# Altium footprint library 13-IC Packages-1bga1.PcbLib: 72 footprints (part 3 of 6)
Each footprint in its own frame and in the unit in brackets; x right, y up, seen from the top. Pads: shape width x height; smd on the part's side, far side on the other; paste and mask are expansions set on the pad; w line width, h text height; cw(c..) or ccw(c..) is an arc to the next point about the centre after c.
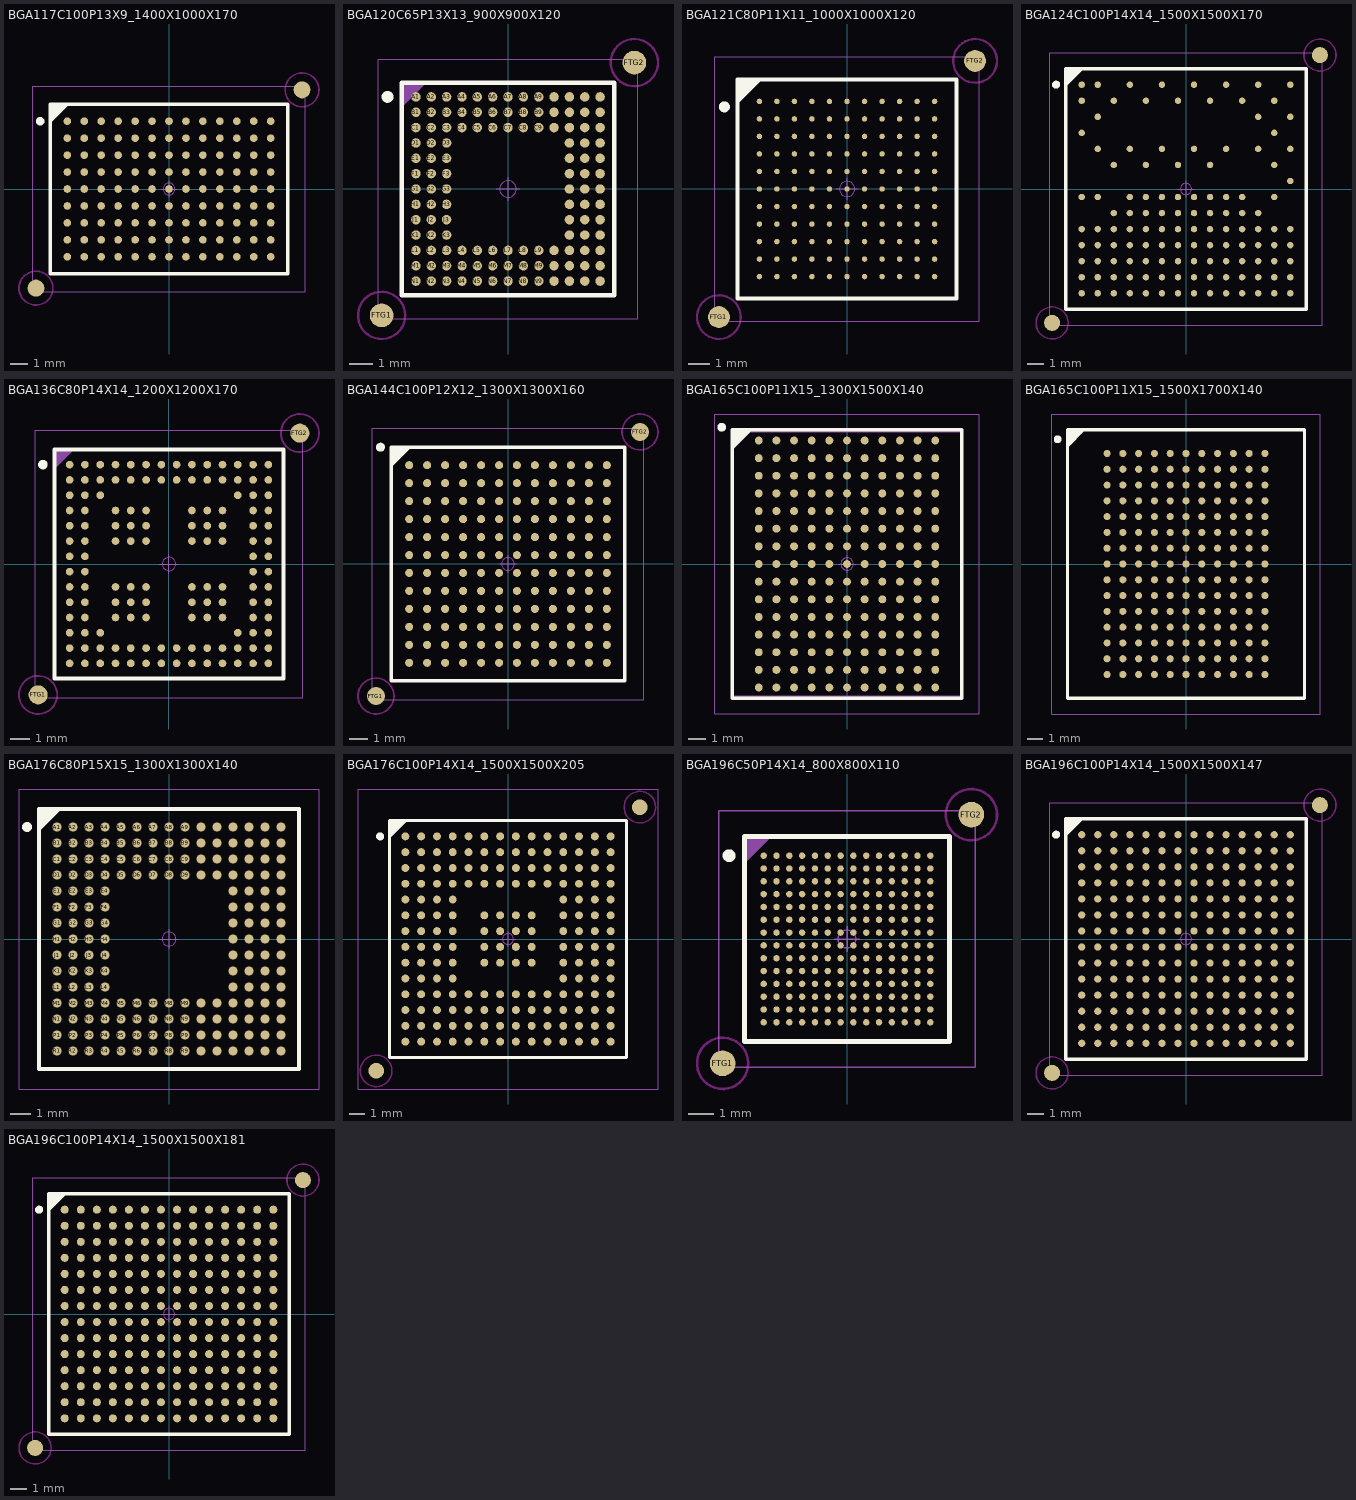
[diagram p2: the footprints below, top view; thin cyan lines are the x and y axes]

## BGA117C100P13X9_1400X1000X170 [mm] "BGA, 1.00mm Pitch, Rect.; 117 pin, 13 Columns X 9 Rows, 14.00mm X 10.00mm X 1.70mm H"
height 1.7
pads (119):
  round 0.45 smd: A1(-6,4) A2(-5,4) A3(-4,4) A4(-3,4) A5(-2,4) A6(-1,4) A7(0,4) A8(1,4) A9(2,4) A10(3,4) A11(4,4) A12(5,4) A13(6,4) B1(-6,3) B2(-5,3) B3(-4,3) B4(-3,3) B5(-2,3) B6(-1,3) B7(0,3) B8(1,3) B9(2,3) B10(3,3) B11(4,3) B12(5,3) B13(6,3) C1(-6,2) C2(-5,2) C3(-4,2) C4(-3,2) C5(-2,2) C6(-1,2) C7(0,2) C8(1,2) C9(2,2) C10(3,2) C11(4,2) C12(5,2) C13(6,2) D1(-6,1) D2(-5,1) D3(-4,1) D4(-3,1) D5(-2,1) D6(-1,1) D7(0,1) D8(1,1) D9(2,1) D10(3,1) D11(4,1) D12(5,1) D13(6,1) E1(-6,0) E2(-5,0) E3(-4,0) E4(-3,0) E5(-2,0) E6(-1,0) E7(0,0) E8(1,0) E9(2,0) E10(3,0) E11(4,0) E12(5,0) E13(6,0) F1(-6,-1) F2(-5,-1) F3(-4,-1) F4(-3,-1) F5(-2,-1) F6(-1,-1) F7(0,-1) F8(1,-1) F9(2,-1) F10(3,-1) F11(4,-1) F12(5,-1) F13(6,-1) G1(-6,-2) G2(-5,-2) G3(-4,-2) G4(-3,-2) G5(-2,-2) G6(-1,-2) G7(0,-2) G8(1,-2) G9(2,-2) G10(3,-2) G11(4,-2) G12(5,-2) G13(6,-2) H1(-6,-3) H2(-5,-3) H3(-4,-3) H4(-3,-3) H5(-2,-3) H6(-1,-3) H7(0,-3) H8(1,-3) H9(2,-3) H10(3,-3) H11(4,-3) H12(5,-3) H13(6,-3) J1(-6,-4) J2(-5,-4) J3(-4,-4) J4(-3,-4) J5(-2,-4) J6(-1,-4) J7(0,-4) J8(1,-4) J9(2,-4) J10(3,-4) J11(4,-4) J12(5,-4) J13(6,-4)
  round 1 smd paste-0.51 mask+0.5: FTG1(-7.85,-5.85) FTG2(7.85,5.85)
Top Layer keep-out:
  circle w0.1: c7.85,5.85 r1
  circle w0.1: c-7.85,-5.85 r1
Top Overlay:
  circle w0.25: c-7.6,4 r0.125
  lines w0.2: -7,4 -6,5 ; -7,4.2 -6.2,5 ; -7,4.4 -6.4,5 ; -7,4.6 -6.6,5 ; -7,4.8 -6.8,5 ; -7,-5 7,-5 7,5 -7,5 -7,-5
Mechanical 14:
  lines w0.1: -7,4 -6,5 ; -7,4.1 -6.1,5 ; -7,4.2 -6.2,5 ; -7,4.3 -6.3,5 ; -7,4.4 -6.4,5 ; -7,4.5 -6.5,5 ; -7,4.6 -6.6,5 ; -7,4.7 -6.7,5 ; -7,4.8 -6.8,5 ; -7,4.9 -6.9,5 ; -7,-5 7,-5 7,5 -7,5 -7,-5
Mechanical 15:
  circle w0.05: c0,0 r0.35
  lines w0.05: -0.5,0 0.5,0 ; 0,-0.5 0,0.5 ; -8.05,-6.05 8.05,-6.05 8.05,6.05 -8.05,6.05 -8.05,-6.05
3D body "BGA117C100P13X9_1400X1000X170.stp": height 1.7, standoff 0, extent -7,-5 7,5

## BGA120C65P13X13_900X900X120 [mm] "BGA, 0.65mm Pitch, Square; 120 Pin, 13 Columns X 13 Rows, 9.00mm X 9.00mm X 1.20mm H"
height 1.2
pads (122):
  round 0.4 smd: A1(-3.9,3.9) A2(-3.25,3.9) A3(-2.6,3.9) A4(-1.95,3.9) A5(-1.3,3.9) A6(-0.65,3.9) A7(0,3.9) A8(0.65,3.9) A9(1.3,3.9) A10(1.95,3.9) A11(2.6,3.9) A12(3.25,3.9) A13(3.9,3.9) B1(-3.9,3.25) B2(-3.25,3.25) B3(-2.6,3.25) B4(-1.95,3.25) B5(-1.3,3.25) B6(-0.65,3.25) B7(0,3.25) B8(0.65,3.25) B9(1.3,3.25) B10(1.95,3.25) B11(2.6,3.25) B12(3.25,3.25) B13(3.9,3.25) C1(-3.9,2.6) C2(-3.25,2.6) C3(-2.6,2.6) C4(-1.95,2.6) C5(-1.3,2.6) C6(-0.65,2.6) C7(0,2.6) C8(0.65,2.6) C9(1.3,2.6) C10(1.95,2.6) C11(2.6,2.6) C12(3.25,2.6) C13(3.9,2.6) D1(-3.9,1.95) D2(-3.25,1.95) D3(-2.6,1.95) D11(2.6,1.95) D12(3.25,1.95) D13(3.9,1.95) E1(-3.9,1.3) E2(-3.25,1.3) E3(-2.6,1.3) E11(2.6,1.3) E12(3.25,1.3) E13(3.9,1.3) F1(-3.9,0.65) F2(-3.25,0.65) F3(-2.6,0.65) F11(2.6,0.65) F12(3.25,0.65) F13(3.9,0.65) G1(-3.9,0) G2(-3.25,0) G3(-2.6,0) G11(2.6,0) G12(3.25,0) G13(3.9,0) H1(-3.9,-0.65) H2(-3.25,-0.65) H3(-2.6,-0.65) H11(2.6,-0.65) H12(3.25,-0.65) H13(3.9,-0.65) J1(-3.9,-1.3) J2(-3.25,-1.3) J3(-2.6,-1.3) J11(2.6,-1.3) J12(3.25,-1.3) J13(3.9,-1.3) K1(-3.9,-1.95) K2(-3.25,-1.95) K3(-2.6,-1.95) K11(2.6,-1.95) K12(3.25,-1.95) K13(3.9,-1.95) L1(-3.9,-2.6) L2(-3.25,-2.6) L3(-2.6,-2.6) L4(-1.95,-2.6) L5(-1.3,-2.6) L6(-0.65,-2.6) L7(0,-2.6) L8(0.65,-2.6) L9(1.3,-2.6) L10(1.95,-2.6) L11(2.6,-2.6) L12(3.25,-2.6) L13(3.9,-2.6) M1(-3.9,-3.25) M2(-3.25,-3.25) M3(-2.6,-3.25) M4(-1.95,-3.25) M5(-1.3,-3.25) M6(-0.65,-3.25) M7(0,-3.25) M8(0.65,-3.25) M9(1.3,-3.25) M10(1.95,-3.25) M11(2.6,-3.25) M12(3.25,-3.25) M13(3.9,-3.25) N1(-3.9,-3.9) N2(-3.25,-3.9) N3(-2.6,-3.9) N4(-1.95,-3.9) N5(-1.3,-3.9) N6(-0.65,-3.9) N7(0,-3.9) N8(0.65,-3.9) N9(1.3,-3.9) N10(1.95,-3.9) N11(2.6,-3.9) N12(3.25,-3.9) N13(3.9,-3.9)
  round 1 smd paste-0.51 mask+0.5: FTG1(-5.35,-5.35) FTG2(5.35,5.35)
Top Layer keep-out:
  circle w0.1: c-5.35,-5.35 r1
  circle w0.1: c5.35,5.35 r1
Top Overlay:
  circle w0.25: c-5.1,3.9 r0.125
  lines w0.2: -4.5,-4.5 4.5,-4.5 4.5,4.5 -4.5,4.5 -4.5,-4.5
Mechanical 14:
  lines w0.1: -4.5,3.5 -3.5,4.5 ; -4.5,3.6 -3.6,4.5 ; -4.5,3.7 -3.7,4.5 ; -4.5,3.8 -3.8,4.5 ; -4.5,3.9 -3.9,4.5 ; -4.5,4 -4,4.5 ; -4.5,4.1 -4.1,4.5 ; -4.5,4.2 -4.2,4.5 ; -4.5,4.3 -4.3,4.5 ; -4.5,4.4 -4.4,4.5 ; -4.5,-4.5 4.5,-4.5 4.5,4.5 -4.5,4.5 -4.5,-4.5
  text "N" at -5.1,-4.2 h0.5
  text "M" at -5.1,-3.55 h0.5
  text "L" at -5.1,-2.9 h0.5
  text "K" at -5.1,-2.25 h0.5
  text "J" at -5.1,-1.6 h0.5
  text "H" at -5.1,-0.95 h0.5
  text "G" at -5.1,-0.3 h0.5
  text "F" at -5.1,0.35 h0.5
  text "E" at -5.1,1 h0.5
  text "D" at -5.1,1.65 h0.5
  text "C" at -5.1,2.3 h0.5
  text "B" at -5.1,2.95 h0.5
  text "A" at -5.1,3.6 h0.5
  text "13" at 4.15,4.8 h0.5
  text "12" at 3.5,4.8 h0.5
  text "11" at 2.85,4.8 h0.5
  text "10" at 2.2,4.8 h0.5
  text "9" at 1.55,4.8 h0.5
  text "8" at 0.9,4.8 h0.5
  text "7" at 0.25,4.8 h0.5
  text "6" at -0.4,4.8 h0.5
  text "5" at -1.05,4.8 h0.5
  text "4" at -1.7,4.8 h0.5
  text "3" at -2.35,4.8 h0.5
  text "2" at -3,4.8 h0.5
  text "1" at -3.65,4.8 h0.5
Mechanical 15:
  circle w0.05: c0,0 r0.35
  lines w0.05: -0.5,0 0.5,0 ; 0,-0.5 0,0.5 ; -5.5,-5.5 5.5,-5.5 5.5,5.5 -5.5,5.5 -5.5,-5.5
3D body "BGA120C65P13X13_900X900X120.stp": height 1.2, standoff 0, extent -4.5,-4.5 4.5,4.5

## BGA121C80P11X11_1000X1000X120 [mm] "BGA, 0.80mm Pitch, Square; 121 Pin,11 Columns X 11 Rows,10.00mm X 10.00mm X 1.20mm H"
height 1.2
pads (123):
  round 0.25 smd: A1(-4,4) A2(-3.2,4) A3(-2.4,4) A4(-1.6,4) A5(-0.8,4) A6(0,4) A7(0.8,4) A8(1.6,4) A9(2.4,4) A10(3.2,4) A11(4,4) B1(-4,3.2) B2(-3.2,3.2) B3(-2.4,3.2) B4(-1.6,3.2) B5(-0.8,3.2) B6(0,3.2) B7(0.8,3.2) B8(1.6,3.2) B9(2.4,3.2) B10(3.2,3.2) B11(4,3.2) C1(-4,2.4) C2(-3.2,2.4) C3(-2.4,2.4) C4(-1.6,2.4) C5(-0.8,2.4) C6(0,2.4) C7(0.8,2.4) C8(1.6,2.4) C9(2.4,2.4) C10(3.2,2.4) C11(4,2.4) D1(-4,1.6) D2(-3.2,1.6) D3(-2.4,1.6) D4(-1.6,1.6) D5(-0.8,1.6) D6(0,1.6) D7(0.8,1.6) D8(1.6,1.6) D9(2.4,1.6) D10(3.2,1.6) D11(4,1.6) E1(-4,0.8) E2(-3.2,0.8) E3(-2.4,0.8) E4(-1.6,0.8) E5(-0.8,0.8) E6(0,0.8) E7(0.8,0.8) E8(1.6,0.8) E9(2.4,0.8) E10(3.2,0.8) E11(4,0.8) F1(-4,0) F2(-3.2,0) F3(-2.4,0) F4(-1.6,0) F5(-0.8,0) F6(0,0) F7(0.8,0) F8(1.6,0) F9(2.4,0) F10(3.2,0) F11(4,0) G1(-4,-0.8) G2(-3.2,-0.8) G3(-2.4,-0.8) G4(-1.6,-0.8) G5(-0.8,-0.8) G6(0,-0.8) G7(0.8,-0.8) G8(1.6,-0.8) G9(2.4,-0.8) G10(3.2,-0.8) G11(4,-0.8) H1(-4,-1.6) H2(-3.2,-1.6) H3(-2.4,-1.6) H4(-1.6,-1.6) H5(-0.8,-1.6) H6(0,-1.6) H7(0.8,-1.6) H8(1.6,-1.6) H9(2.4,-1.6) H10(3.2,-1.6) H11(4,-1.6) J1(-4,-2.4) J2(-3.2,-2.4) J3(-2.4,-2.4) J4(-1.6,-2.4) J5(-0.8,-2.4) J6(0,-2.4) J7(0.8,-2.4) J8(1.6,-2.4) J9(2.4,-2.4) J10(3.2,-2.4) J11(4,-2.4) K1(-4,-3.2) K2(-3.2,-3.2) K3(-2.4,-3.2) K4(-1.6,-3.2) K5(-0.8,-3.2) K6(0,-3.2) K7(0.8,-3.2) K8(1.6,-3.2) K9(2.4,-3.2) K10(3.2,-3.2) K11(4,-3.2) L1(-4,-4) L2(-3.2,-4) L3(-2.4,-4) L4(-1.6,-4) L5(-0.8,-4) L6(0,-4) L7(0.8,-4) L8(1.6,-4) L9(2.4,-4) L10(3.2,-4) L11(4,-4)
  round 1 smd paste-0.51 mask+0.5: FTG1(-5.85,-5.85) FTG2(5.85,5.85)
Top Layer keep-out:
  circle w0.1: c-5.85,-5.85 r1
  circle w0.1: c5.85,5.85 r1
Top Overlay:
  circle w0.25: c-5.6,3.75 r0.125
  lines w0.2: -5,4 -4,5 ; -5,4.2 -4.2,5 ; -5,4.4 -4.4,5 ; -5,4.6 -4.6,5 ; -5,4.8 -4.8,5 ; -5,-5 -5,5 5,5 5,-5 -5,-5
Mechanical 14:
  lines w0.1: -5,4 -4,5 ; -5,4.1 -4.1,5 ; -5,4.2 -4.2,5 ; -5,4.3 -4.3,5 ; -5,4.4 -4.4,5 ; -5,4.5 -4.5,5 ; -5,4.6 -4.6,5 ; -5,4.7 -4.7,5 ; -5,4.8 -4.8,5 ; -5,4.9 -4.9,5 ; -5,-5 -5,5 5,5 5,-5 -5,-5
  text "L" at -5.625,-4.075 h0.4
  text "K" at -5.625,-3.275 h0.4
  text "H" at -5.625,-1.675 h0.4
  text "G" at -5.625,-0.875 h0.4
  text "F" at -5.625,-0.075 h0.4
  text "E" at -5.625,0.725 h0.4
  text "D" at -5.625,1.525 h0.4
  text "C" at -5.625,2.325 h0.4
  text "B" at -5.625,3.125 h0.4
  text "A" at -5.625,3.925 h0.4
  text "J" at -5.625,-2.475 h0.4
  text "10" at 3.075,5.275 h0.4
  text "11" at 4.025,5.275 h0.4
  text "7" at 0.675,5.275 h0.4
  text "8" at 1.475,5.275 h0.4
  text "9" at 2.275,5.275 h0.4
  text "4" at -1.725,5.275 h0.4
  text "5" at -0.925,5.275 h0.4
  text "6" at -0.125,5.275 h0.4
  text "3" at -2.525,5.275 h0.4
  text "2" at -3.325,5.275 h0.4
  text "1" at -4.125,5.275 h0.4
Mechanical 15:
  circle w0.05: c0,0 r0.35
  lines w0.05: -0.5,0 0.5,0 ; 0,-0.5 0,0.5 ; -6.05,-6.05 -6.05,6.05 6.05,6.05 6.05,-6.05 -6.05,-6.05
3D body "BGA121C80P11X11_1000X1000X120.stp": height 1.2, standoff 0, extent -5.05,-5.05 5.05,5.05

## BGA124C100P14X14_1500X1500X170 [mm] "BGA, 1.00mm Pitch, Square;124 Pin,14 Columns X 14 Rows, 15.00mm X 15.00mm X 1.70mm H"
height 1.47
pads (126):
  round 0.4 smd: A1(-6.5,6.5) A2(-5.5,6.5) A4(-3.5,6.5) A6(-1.5,6.5) A8(0.5,6.5) A10(2.5,6.5) A12(4.5,6.5) A14(6.5,6.5) B1(-6.5,5.5) B3(-4.5,5.5) B5(-2.5,5.5) B7(-0.5,5.5) B9(1.5,5.5) B11(3.5,5.5) B13(5.5,5.5) C2(-5.5,4.5) C12(4.5,4.5) C14(6.5,4.5) D1(-6.5,3.5) D13(5.5,3.5) E2(-5.5,2.5) E4(-3.5,2.5) E6(-1.5,2.5) E8(0.5,2.5) E10(2.5,2.5) E12(4.5,2.5) E14(6.5,2.5) F3(-4.5,1.5) F5(-2.5,1.5) F7(-0.5,1.5) F9(1.5,1.5) F13(5.5,1.5) G14(6.5,0.5) H1(-6.5,-0.5) H2(-5.5,-0.5) H4(-3.5,-0.5) H5(-2.5,-0.5) H6(-1.5,-0.5) H7(-0.5,-0.5) H8(0.5,-0.5) H9(1.5,-0.5) H10(2.5,-0.5) H11(3.5,-0.5) H13(5.5,-0.5) J3(-4.5,-1.5) J4(-3.5,-1.5) J5(-2.5,-1.5) J6(-1.5,-1.5) J7(-0.5,-1.5) J8(0.5,-1.5) J9(1.5,-1.5) J10(2.5,-1.5) J11(3.5,-1.5) J12(4.5,-1.5) K1(-6.5,-2.5) K2(-5.5,-2.5) K3(-4.5,-2.5) K4(-3.5,-2.5) K5(-2.5,-2.5) K6(-1.5,-2.5) K7(-0.5,-2.5) K8(0.5,-2.5) K9(1.5,-2.5) K10(2.5,-2.5) K11(3.5,-2.5) K12(4.5,-2.5) K13(5.5,-2.5) K14(6.5,-2.5) L1(-6.5,-3.5) L2(-5.5,-3.5) L3(-4.5,-3.5) L4(-3.5,-3.5) L5(-2.5,-3.5) L6(-1.5,-3.5) L7(-0.5,-3.5) L8(0.5,-3.5) L9(1.5,-3.5) L10(2.5,-3.5) L11(3.5,-3.5) L12(4.5,-3.5) L13(5.5,-3.5) L14(6.5,-3.5) M1(-6.5,-4.5) M2(-5.5,-4.5) M3(-4.5,-4.5) M4(-3.5,-4.5) M5(-2.5,-4.5) M6(-1.5,-4.5) M7(-0.5,-4.5) M8(0.5,-4.5) M9(1.5,-4.5) M10(2.5,-4.5) M11(3.5,-4.5) M12(4.5,-4.5) M13(5.5,-4.5) M14(6.5,-4.5) N1(-6.5,-5.5) N2(-5.5,-5.5) N3(-4.5,-5.5) N4(-3.5,-5.5) N5(-2.5,-5.5) N6(-1.5,-5.5) N7(-0.5,-5.5) N8(0.5,-5.5) N9(1.5,-5.5) N10(2.5,-5.5) N11(3.5,-5.5) N12(4.5,-5.5) N13(5.5,-5.5) N14(6.5,-5.5) P1(-6.5,-6.5) P2(-5.5,-6.5) P3(-4.5,-6.5) P4(-3.5,-6.5) P5(-2.5,-6.5) P6(-1.5,-6.5) P7(-0.5,-6.5) P8(0.5,-6.5) P9(1.5,-6.5) P10(2.5,-6.5) P11(3.5,-6.5) P12(4.5,-6.5) P13(5.5,-6.5) P14(6.5,-6.5)
  round 1 smd paste-0.51 mask+0.5: FTG1(-8.35,-8.35) FTG2(8.35,8.35)
Top Layer keep-out:
  circle w0.1: c8.35,8.35 r1
  circle w0.1: c-8.35,-8.35 r1
Top Overlay:
  circle w0.25: c-8.1,6.5 r0.125
  circle w0.25: c-8.1,6.5 r0.125
  lines w0.2: -7.5,6.5 -6.5,7.5 ; -7.5,6.7 -6.7,7.5 ; -7.5,6.9 -6.9,7.5 ; -7.5,7.1 -7.1,7.5 ; -7.5,7.3 -7.3,7.5 ; -7.5,-7.5 -7.5,7.5 7.5,7.5 7.5,-7.5 -7.5,-7.5
Mechanical 14:
  lines w0.1: -7.5,6.5 -6.5,7.5 ; -7.5,6.6 -6.6,7.5 ; -7.5,6.7 -6.7,7.5 ; -7.5,6.8 -6.8,7.5 ; -7.5,6.9 -6.9,7.5 ; -7.5,7 -7,7.5 ; -7.5,7.1 -7.1,7.5 ; -7.5,7.2 -7.2,7.5 ; -7.5,7.3 -7.3,7.5 ; -7.5,7.4 -7.4,7.5 ; -7.5,-7.5 -7.5,7.5 7.5,7.5 7.5,-7.5 -7.5,-7.5
  text "P" at -8.4,-6.8 h0.6
  text "N" at -8.4,-5.8 h0.6
  text "M" at -8.4,-4.8 h0.6
  text "L" at -8.4,-3.8 h0.6
  text "K" at -8.4,-2.8 h0.6
  text "J" at -8.4,-1.8 h0.6
  text "H" at -8.4,-0.8 h0.6
  text "G" at -8.4,0.2 h0.6
  text "F" at -8.4,1.2 h0.6
  text "E" at -8.4,2.2 h0.6
  text "D" at -8.4,3.2 h0.6
  text "C" at -8.4,4.2 h0.6
  text "B" at -8.4,5.2 h0.6
  text "A" at -8.4,6.2 h0.6
  text "2" at -5.125,8 h0.6
  text "3" at -4.125,8 h0.6
  text "4" at -3.125,8 h0.6
  text "5" at -2.125,8 h0.6
  text "14" at 6.65,8 h0.6
  text "13" at 5.675,8 h0.6
  text "12" at 4.7,8 h0.6
  text "11" at 3.775,8 h0.6
  text "10" at 2.725,8 h0.6
  text "9" at 1.925,8 h0.6
  text "8" at 0.85,8 h0.6
  text "7" at -0.125,8 h0.6
  text "6" at -1.125,8 h0.6
  text "1" at -6.075,8 h0.6
Mechanical 15:
  circle w0.05: c0,0 r0.35
  lines w0.05: -0.5,0 0.5,0 ; 0,-0.5 0,0.5 ; -8.5,-8.5 -8.5,8.5 8.5,8.5 8.5,-8.5 -8.5,-8.5
3D body "BGA124C100P14X14_1500X1500X170.stp": height 1.7, standoff 0, extent -7.6,-7.6 7.6,7.6

## BGA136C80P14X14_1200X1200X170 [mm] "BGA, 0.80mm Pitch, Square; 136 Pin, 14 Columns X 14 Rows, 12.00mm X 12.00mm X 1.70mm H"
height 1.7
pads (138):
  round 0.4 smd: A1(-5.2,5.2) A2(-4.4,5.2) A3(-3.6,5.2) A4(-2.8,5.2) A5(-2,5.2) A6(-1.2,5.2) A7(-0.4,5.2) A8(0.4,5.2) A9(1.2,5.2) A10(2,5.2) A11(2.8,5.2) A12(3.6,5.2) A13(4.4,5.2) A14(5.2,5.2) B1(-5.2,4.4) B2(-4.4,4.4) B3(-3.6,4.4) B4(-2.8,4.4) B5(-2,4.4) B6(-1.2,4.4) B7(-0.4,4.4) B8(0.4,4.4) B9(1.2,4.4) B10(2,4.4) B11(2.8,4.4) B12(3.6,4.4) B13(4.4,4.4) B14(5.2,4.4) C1(-5.2,3.6) C2(-4.4,3.6) C3(-3.6,3.6) C12(3.6,3.6) C13(4.4,3.6) C14(5.2,3.6) D1(-5.2,2.8) D2(-4.4,2.8) D4(-2.8,2.8) D5(-2,2.8) D6(-1.2,2.8) D9(1.2,2.8) D10(2,2.8) D11(2.8,2.8) D13(4.4,2.8) D14(5.2,2.8) E1(-5.2,2) E2(-4.4,2) E4(-2.8,2) E5(-2,2) E6(-1.2,2) E9(1.2,2) E10(2,2) E11(2.8,2) E13(4.4,2) E14(5.2,2) F1(-5.2,1.2) F2(-4.4,1.2) F4(-2.8,1.2) F5(-2,1.2) F6(-1.2,1.2) F9(1.2,1.2) F10(2,1.2) F11(2.8,1.2) F13(4.4,1.2) F14(5.2,1.2) G1(-5.2,0.4) G2(-4.4,0.4) G13(4.4,0.4) G14(5.2,0.4) H1(-5.2,-0.4) H2(-4.4,-0.4) H13(4.4,-0.4) H14(5.2,-0.4) J1(-5.2,-1.2) J2(-4.4,-1.2) J4(-2.8,-1.2) J5(-2,-1.2) J6(-1.2,-1.2) J9(1.2,-1.2) J10(2,-1.2) J11(2.8,-1.2) J13(4.4,-1.2) J14(5.2,-1.2) K1(-5.2,-2) K2(-4.4,-2) K4(-2.8,-2) K5(-2,-2) K6(-1.2,-2) K9(1.2,-2) K10(2,-2) K11(2.8,-2) K13(4.4,-2) K14(5.2,-2) L1(-5.2,-2.8) L2(-4.4,-2.8) L4(-2.8,-2.8) L5(-2,-2.8) L6(-1.2,-2.8) L9(1.2,-2.8) L10(2,-2.8) L11(2.8,-2.8) L13(4.4,-2.8) L14(5.2,-2.8) M1(-5.2,-3.6) M2(-4.4,-3.6) M3(-3.6,-3.6) M12(3.6,-3.6) M13(4.4,-3.6) M14(5.2,-3.6) N1(-5.2,-4.4) N2(-4.4,-4.4) N3(-3.6,-4.4) N4(-2.8,-4.4) N5(-2,-4.4) N6(-1.2,-4.4) N7(-0.4,-4.4) N8(0.4,-4.4) N9(1.2,-4.4) N10(2,-4.4) N11(2.8,-4.4) N12(3.6,-4.4) N13(4.4,-4.4) N14(5.2,-4.4) P1(-5.2,-5.2) P2(-4.4,-5.2) P3(-3.6,-5.2) P4(-2.8,-5.2) P5(-2,-5.2) P6(-1.2,-5.2) P7(-0.4,-5.2) P8(0.4,-5.2) P9(1.2,-5.2) P10(2,-5.2) P11(2.8,-5.2) P12(3.6,-5.2) P13(4.4,-5.2) P14(5.2,-5.2)
  round 1 smd paste-0.51 mask+0.5: FTG1(-6.85,-6.85) FTG2(6.85,6.85)
Top Layer keep-out:
  circle w0.1: c6.85,6.85 r1
  circle w0.1: c-6.85,-6.85 r1
Top Overlay:
  circle w0.25: c-6.6,5.2 r0.125
  lines w0.2: -6,-6 -6,6 6,6 6,-6 -6,-6
Mechanical 14:
  lines w0.1: -6,5 -5,6 ; -6,5.1 -5.1,6 ; -6,5.2 -5.2,6 ; -6,5.3 -5.3,6 ; -6,5.4 -5.4,6 ; -6,5.5 -5.5,6 ; -6,5.6 -5.6,6 ; -6,5.7 -5.7,6 ; -6,5.8 -5.8,6 ; -6,5.9 -5.9,6 ; -6,-6 -6,6 6,6 6,-6 -6,-6
  text "J" at -6.5,-1.2 h0.4
  text "P" at -6.5,-5.2 h0.4
  text "N" at -6.5,-4.4 h0.4
  text "A" at -6.5,5.2 h0.4
  text "B" at -6.5,4.4 h0.4
  text "C" at -6.5,3.6 h0.4
  text "D" at -6.5,2.8 h0.4
  text "E" at -6.5,2 h0.4
  text "F" at -6.5,1.2 h0.4
  text "G" at -6.5,0.4 h0.4
  text "H" at -6.5,-0.4 h0.4
  text "M" at -6.5,-3.6 h0.4
  text "K" at -6.5,-2 h0.4
  text "L" at -6.5,-2.8 h0.4
  text "13" at 6.975,6.7 h0.6
  text "1" at -5.325,6.475 h0.4
  text "2" at -4.525,6.475 h0.4
  text "3" at -3.725,6.475 h0.4
  text "6" at -1.325,6.475 h0.4
  text "5" at -2.125,6.475 h0.4
  text "4" at -2.925,6.475 h0.4
  text "9" at 1.075,6.475 h0.4
  text "8" at 0.275,6.475 h0.4
  text "7" at -0.525,6.475 h0.4
  text "12" at 3.475,6.475 h0.4
  text "11" at 2.675,6.475 h0.4
  text "10" at 1.875,6.475 h0.4
  text "13" at 4.275,6.475 h0.4
  text "14" at 5.075,6.475 h0.4
Mechanical 15:
  circle w0.05: c0,0 r0.35
  lines w0.05: -0.5,0 0.5,0 ; 0,-0.5 0,0.5 ; -7,-7 -7,7 7,7 7,-7 -7,-7
3D body "BGA136C80P14X14_1200X1200X170.stp": height 1.7, standoff 0, extent -6.05,-6.05 6.05,6.05

## BGA144C100P12X12_1300X1300X160 [mm] "BGA, 1.00mm pitch, square; 144 pin, 12 columns X 12 rows,13.00mm X 13.00mm X 1.60mm H"
height 1.6
pads (146):
  round 0.45 smd: A1(-5.5,5.5) A2(-4.5,5.5) A3(-3.5,5.5) A4(-2.5,5.5) A5(-1.5,5.5) A6(-0.5,5.5) A7(0.5,5.5) A8(1.5,5.5) A9(2.5,5.5) A10(3.5,5.5) A11(4.5,5.5) A12(5.5,5.5) B1(-5.5,4.5) B2(-4.5,4.5) B3(-3.5,4.5) B4(-2.5,4.5) B5(-1.5,4.5) B6(-0.5,4.5) B7(0.5,4.5) B8(1.5,4.5) B9(2.5,4.5) B10(3.5,4.5) B11(4.5,4.5) B12(5.5,4.5) C1(-5.5,3.5) C2(-4.5,3.5) C3(-3.5,3.5) C4(-2.5,3.5) C5(-1.5,3.5) C6(-0.5,3.5) C7(0.5,3.5) C8(1.5,3.5) C9(2.5,3.5) C10(3.5,3.5) C11(4.5,3.5) C12(5.5,3.5) D1(-5.5,2.5) D2(-4.5,2.5) D3(-3.5,2.5) D4(-2.5,2.5) D5(-1.5,2.5) D6(-0.5,2.5) D7(0.5,2.5) D8(1.5,2.5) D9(2.5,2.5) D10(3.5,2.5) D11(4.5,2.5) D12(5.5,2.5) E1(-5.5,1.5) E2(-4.5,1.5) E3(-3.5,1.5) E4(-2.5,1.5) E5(-1.5,1.5) E6(-0.5,1.5) E7(0.5,1.5) E8(1.5,1.5) E9(2.5,1.5) E10(3.5,1.5) E11(4.5,1.5) E12(5.5,1.5) F1(-5.5,0.5) F2(-4.5,0.5) F3(-3.5,0.5) F4(-2.5,0.5) F5(-1.5,0.5) F6(-0.5,0.5) F7(0.5,0.5) F8(1.5,0.5) F9(2.5,0.5) F10(3.5,0.5) F11(4.5,0.5) F12(5.5,0.5) G1(-5.5,-0.5) G2(-4.5,-0.5) G3(-3.5,-0.5) G4(-2.5,-0.5) G5(-1.5,-0.5) G6(-0.5,-0.5) G7(0.5,-0.5) G8(1.5,-0.5) G9(2.5,-0.5) G10(3.5,-0.5) G11(4.5,-0.5) G12(5.5,-0.5) H1(-5.5,-1.5) H2(-4.5,-1.5) H3(-3.5,-1.5) H4(-2.5,-1.5) H5(-1.5,-1.5) H6(-0.5,-1.5) H7(0.5,-1.5) H8(1.5,-1.5) H9(2.5,-1.5) H10(3.5,-1.5) H11(4.5,-1.5) H12(5.5,-1.5) J1(-5.5,-2.5) J2(-4.5,-2.5) J3(-3.5,-2.5) J4(-2.5,-2.5) J5(-1.5,-2.5) J6(-0.5,-2.5) J7(0.5,-2.5) J8(1.5,-2.5) J9(2.5,-2.5) J10(3.5,-2.5) J11(4.5,-2.5) J12(5.5,-2.5) K1(-5.5,-3.5) K2(-4.5,-3.5) K3(-3.5,-3.5) K4(-2.5,-3.5) K5(-1.5,-3.5) K6(-0.5,-3.5) K7(0.5,-3.5) K8(1.5,-3.5) K9(2.5,-3.5) K10(3.5,-3.5) K11(4.5,-3.5) K12(5.5,-3.5) L1(-5.5,-4.5) L2(-4.5,-4.5) L3(-3.5,-4.5) L4(-2.5,-4.5) L5(-1.5,-4.5) L6(-0.5,-4.5) L7(0.5,-4.5) L8(1.5,-4.5) L9(2.5,-4.5) L10(3.5,-4.5) L11(4.5,-4.5) L12(5.5,-4.5) M1(-5.5,-5.5) M2(-4.5,-5.5) M3(-3.5,-5.5) M4(-2.5,-5.5) M5(-1.5,-5.5) M6(-0.5,-5.5) M7(0.5,-5.5) M8(1.5,-5.5) M9(2.5,-5.5) M10(3.5,-5.5) M11(4.5,-5.5) M12(5.5,-5.5)
  round 1 smd paste-0.51 mask+0.5: FTG1(-7.35,-7.35) FTG2(7.35,7.35)
Top Layer keep-out:
  circle w0.1: c7.35,7.35 r1
  circle w0.1: c-7.35,-7.35 r1
Top Overlay:
  circle w0.25: c-7.1,6.5 r0.125
  lines w0.2: -6.5,5.5 -5.5,6.5 ; -6.5,5.7 -5.7,6.5 ; -6.5,5.9 -5.9,6.5 ; -6.5,6.1 -6.1,6.5 ; -6.5,6.3 -6.3,6.5 ; -6.5,-6.5 6.5,-6.5 6.5,6.5 -6.5,6.5 -6.5,-6.5
Mechanical 14:
  lines w0.1: -6.5,5.5 -5.5,6.5 ; -6.5,5.6 -5.6,6.5 ; -6.5,5.7 -5.7,6.5 ; -6.5,5.8 -5.8,6.5 ; -6.5,5.9 -5.9,6.5 ; -6.5,6 -6,6.5 ; -6.5,6.1 -6.1,6.5 ; -6.5,6.2 -6.2,6.5 ; -6.5,6.3 -6.3,6.5 ; -6.5,6.4 -6.4,6.5 ; -6.5,-6.5 6.5,-6.5 6.5,6.5 -6.5,6.5 -6.5,-6.5
  text "12" at 5.675,6.9 h0.6
  text "A" at -7.3,5.2 h0.6
  text "B" at -7.3,4.2 h0.6
  text "C" at -7.3,3.2 h0.6
  text "D" at -7.3,2.2 h0.6
  text "E" at -7.3,1.2 h0.6
  text "F" at -7.3,0.2 h0.6
  text "G" at -7.3,-0.8 h0.6
  text "H" at -7.3,-1.8 h0.6
  text "J" at -7.3,-2.8 h0.6
  text "K" at -7.3,-3.8 h0.6
  text "L" at -7.3,-4.8 h0.6
  text "M" at -7.3,-5.8 h0.6
  text "1" at -5.175,6.9 h0.6
  text "6" at -0.225,6.9 h0.6
  text "7" at 0.775,6.9 h0.6
  text "8" at 1.75,6.9 h0.6
  text "9" at 2.825,6.9 h0.6
  text "10" at 3.625,6.9 h0.6
  text "11" at 4.675,6.9 h0.6
  text "5" at -1.225,6.9 h0.6
  text "4" at -2.225,6.9 h0.6
  text "3" at -3.225,6.9 h0.6
  text "2" at -4.225,6.9 h0.6
Mechanical 15:
  circle w0.05: c0,0 r0.35
  lines w0.05: -0.5,0 0.5,0 ; 0,-0.5 0,0.5 ; -7.55,-7.55 7.55,-7.55 7.55,7.55 -7.55,7.55 -7.55,-7.55
3D body "BGA144C100P12X12_1300X1300X160.stp": height 1.55, standoff 0, extent -6.5,-6.5 6.5,6.5
